# Altium schematic symbol library jlcpcb_2025_04_capacitors_extended_0603.schlib: 3668 symbols (part 16 of 20) (continued)
## GCM1885C2A180JA16D
designator C?  Capacitance: 18pF  (hidden comment: *)
Capacitor, Ceramic (MLCC), 18pF, ±5%, 100V, ±5%, SMD 0603; Manufacturer: Murata Electronics; Manufacturer Part Number: GCM1885C2A180JA16D; Package Size: 0603; JLCPCB Basic Part: No; JLCPCB Part Number: C913624; Supplier 1: LCSC; Category: Capacitors - MLCC; Supplier Part Number 1: C913624; Tolerance: ±5%; Voltage Rating: 100V; RoHS: Yes; ComponentLink1Description: Datasheet; ComponentLink1URL: https://wmsc.lcsc.com/wmsc/upload/file/pdf/v2/lcsc/2201131300_Murata-Electronics-GCM1885C2A180JA16D_C913624.pdf; ComponentLink2Description: JLCPCB Part URL; ComponentLink2URL: https://jlcpcb.com/partdetail/C913624; ComponentLink3Description: LCSC Part URL; ComponentLink3URL: https://lcsc.com/product-detail/Multilayer-Ceramic-Capacitors-MLCC---SMD-SMT_Murata-Electronics-Murata-Electronics-GCM1885C2A180JA16D_C913624.html
footprint CAP-0603 (0603 (1608M) Capacitor)
pins: 1, 2

## GCM1885C2A181FA16D
designator C?  Capacitance: 180pF  (hidden comment: *)
Capacitor, Ceramic (MLCC), 180pF, ±1%, 100V, ±1%, SMD 0603; Manufacturer: Murata Electronics; Manufacturer Part Number: GCM1885C2A181FA16D; Package Size: 0603; JLCPCB Basic Part: No; JLCPCB Part Number: C2170987; Supplier 1: LCSC; Category: Capacitors - MLCC; Supplier Part Number 1: C2170987; Tolerance: ±1%; Voltage Rating: 100V; RoHS: Yes; ComponentLink1Description: Datasheet; ComponentLink1URL: https://wmsc.lcsc.com/wmsc/upload/file/pdf/v2/lcsc/2202040500_Murata-Electronics-GCM1885C2A181FA16D_C2170987.pdf; ComponentLink2Description: JLCPCB Part URL; ComponentLink2URL: https://jlcpcb.com/partdetail/C2170987; ComponentLink3Description: LCSC Part URL; ComponentLink3URL: https://lcsc.com/product-detail/Multilayer-Ceramic-Capacitors-MLCC---SMD-SMT_Murata-Electronics-Murata-Electronics-GCM1885C2A181FA16D_C2170987.html
footprint CAP-0603 (0603 (1608M) Capacitor)
pins: 1, 2

## GCM1885C2A181JA16D
designator C?  Capacitance: 180pF  (hidden comment: *)
Capacitor, Ceramic (MLCC), 180pF, ±5%, 100V, null, ±5%, SMD 0603; Manufacturer: Murata Electronics; Manufacturer Part Number: GCM1885C2A181JA16D; Package Size: 0603; JLCPCB Basic Part: No; JLCPCB Part Number: C440148; Supplier 1: LCSC; Category: Capacitors - MLCC; Supplier Part Number 1: C440148; Tolerance: ±5%; Voltage Rating: 100V; Temperature Coefficient: null; RoHS: Yes; ComponentLink1Description: Datasheet; ComponentLink1URL: https://wmsc.lcsc.com/wmsc/upload/file/pdf/v2/lcsc/2304140030_Murata-Electronics-GCM1885C2A181JA16D_C440148.pdf; ComponentLink2Description: JLCPCB Part URL; ComponentLink2URL: https://jlcpcb.com/partdetail/C440148; ComponentLink3Description: LCSC Part URL; ComponentLink3URL: https://lcsc.com/product-detail/Multilayer-Ceramic-Capacitors-MLCC---SMD-SMT_Murata-Electronics-Murata-Electronics-GCM1885C2A181JA16D_C440148.html
footprint CAP-0603 (0603 (1608M) Capacitor)
pins: 1, 2

## GCM1885C2A200JA16D
designator C?  Capacitance: 20pF  (hidden comment: *)
Capacitor, Ceramic (MLCC), 20pF, ±5%, 100V, C0G, ±5%, SMD 0603; Manufacturer: Murata Electronics; Manufacturer Part Number: GCM1885C2A200JA16D; Package Size: 0603; JLCPCB Basic Part: No; JLCPCB Part Number: C710678; Supplier 1: LCSC; Category: Capacitors - MLCC; Supplier Part Number 1: C710678; Tolerance: ±5%; Voltage Rating: 100V; Temperature Coefficient: C0G; RoHS: Yes; ComponentLink1Description: Datasheet; ComponentLink1URL: https://wmsc.lcsc.com/wmsc/upload/file/pdf/v2/lcsc/2206281745_Murata-Electronics-GCM1885C2A200JA16D_C710678.pdf; ComponentLink2Description: JLCPCB Part URL; ComponentLink2URL: https://jlcpcb.com/partdetail/C710678; ComponentLink3Description: LCSC Part URL; ComponentLink3URL: https://lcsc.com/product-detail/Multilayer-Ceramic-Capacitors-MLCC---SMD-SMT_Murata-Electronics-Murata-Electronics-GCM1885C2A200JA16D_C710678.html
footprint CAP-0603 (0603 (1608M) Capacitor)
pins: 1, 2

## GCM1885C2A220FA16D
designator C?  Capacitance: 22pF  (hidden comment: *)
Capacitor, Ceramic (MLCC), 22pF, ±1%, 100V, ±1%, SMD 0603; Manufacturer: Murata Electronics; Manufacturer Part Number: GCM1885C2A220FA16D; Package Size: 0603; JLCPCB Basic Part: No; JLCPCB Part Number: C2169896; Supplier 1: LCSC; Category: Capacitors - MLCC; Supplier Part Number 1: C2169896; Tolerance: ±1%; Voltage Rating: 100V; RoHS: Yes; ComponentLink1Description: Datasheet; ComponentLink1URL: https://wmsc.lcsc.com/wmsc/upload/file/pdf/v2/lcsc/2202040400_Murata-Electronics-GCM1885C2A220FA16D_C2169896.pdf; ComponentLink2Description: JLCPCB Part URL; ComponentLink2URL: https://jlcpcb.com/partdetail/C2169896; ComponentLink3Description: LCSC Part URL; ComponentLink3URL: https://lcsc.com/product-detail/Multilayer-Ceramic-Capacitors-MLCC---SMD-SMT_Murata-Electronics-Murata-Electronics-GCM1885C2A220FA16D_C2169896.html
footprint CAP-0603 (0603 (1608M) Capacitor)
pins: 1, 2

## GCM1885C2A220JA16D
designator C?  Capacitance: 22pF  (hidden comment: *)
Capacitor, Ceramic (MLCC), 22pF, ±5%, 100V, C0G, ±5%, SMD 0603; Manufacturer: Murata Electronics; Manufacturer Part Number: GCM1885C2A220JA16D; Package Size: 0603; JLCPCB Basic Part: No; JLCPCB Part Number: C408549; Supplier 1: LCSC; Category: Capacitors - MLCC; Supplier Part Number 1: C408549; Tolerance: ±5%; Voltage Rating: 100V; Temperature Coefficient: C0G; RoHS: Yes; ComponentLink1Description: Datasheet; ComponentLink1URL: https://wmsc.lcsc.com/wmsc/upload/file/pdf/v2/lcsc/2304140030_Murata-Electronics-GCM1885C2A220JA16D_C408549.pdf; ComponentLink2Description: JLCPCB Part URL; ComponentLink2URL: https://jlcpcb.com/partdetail/C408549; ComponentLink3Description: LCSC Part URL; ComponentLink3URL: https://lcsc.com/product-detail/Multilayer-Ceramic-Capacitors-MLCC---SMD-SMT_Murata-Electronics-Murata-Electronics-GCM1885C2A220JA16D_C408549.html
footprint CAP-0603 (0603 (1608M) Capacitor)
pins: 1, 2

## GCM1885C2A221JA16D
designator C?  Capacitance: 220pF  (hidden comment: *)
Capacitor, Ceramic (MLCC), 220pF, ±5%, 100V, C0G, ±5%, SMD 0603; Manufacturer: Murata Electronics; Manufacturer Part Number: GCM1885C2A221JA16D; Package Size: 0603; JLCPCB Basic Part: No; JLCPCB Part Number: C388907; Supplier 1: LCSC; Category: Capacitors - MLCC; Supplier Part Number 1: C388907; Tolerance: ±5%; Voltage Rating: 100V; Temperature Coefficient: C0G; RoHS: Yes; ComponentLink1Description: Datasheet; ComponentLink1URL: https://wmsc.lcsc.com/wmsc/upload/file/pdf/v2/lcsc/1912111437_Murata-Electronics-GCM1885C2A221JA16D_C388907.pdf; ComponentLink2Description: JLCPCB Part URL; ComponentLink2URL: https://jlcpcb.com/partdetail/C388907; ComponentLink3Description: LCSC Part URL; ComponentLink3URL: https://lcsc.com/product-detail/Multilayer-Ceramic-Capacitors-MLCC---SMD-SMT_Murata-Electronics-Murata-Electronics-GCM1885C2A221JA16D_C388907.html
footprint CAP-0603 (0603 (1608M) Capacitor)
pins: 1, 2

## GCM1885C2A270FA16D
designator C?  Capacitance: 27pF  (hidden comment: *)
Capacitor, Ceramic (MLCC), 27pF, ±1%, 100V, ±1%, SMD 0603; Manufacturer: Murata Electronics; Manufacturer Part Number: GCM1885C2A270FA16D; Package Size: 0603; JLCPCB Basic Part: No; JLCPCB Part Number: C2176861; Supplier 1: LCSC; Category: Capacitors - MLCC; Supplier Part Number 1: C2176861; Tolerance: ±1%; Voltage Rating: 100V; RoHS: Yes; ComponentLink1Description: Datasheet; ComponentLink1URL: https://wmsc.lcsc.com/wmsc/upload/file/pdf/v2/lcsc/2202040830_Murata-Electronics-GCM1885C2A270FA16D_C2176861.pdf; ComponentLink2Description: JLCPCB Part URL; ComponentLink2URL: https://jlcpcb.com/partdetail/C2176861; ComponentLink3Description: LCSC Part URL; ComponentLink3URL: https://lcsc.com/product-detail/Multilayer-Ceramic-Capacitors-MLCC---SMD-SMT_Murata-Electronics-Murata-Electronics-GCM1885C2A270FA16D_C2176861.html
footprint CAP-0603 (0603 (1608M) Capacitor)
pins: 1, 2

## GCM1885C2A270JA16D
designator C?  Capacitance: 27pF  (hidden comment: *)
Capacitor, Ceramic (MLCC), 27pF, ±5%, 100V, ±5%, SMD 0603; Manufacturer: Murata Electronics; Manufacturer Part Number: GCM1885C2A270JA16D; Package Size: 0603; JLCPCB Basic Part: No; JLCPCB Part Number: C909846; Supplier 1: LCSC; Category: Capacitors - MLCC; Supplier Part Number 1: C909846; Tolerance: ±5%; Voltage Rating: 100V; RoHS: Yes; ComponentLink1Description: Datasheet; ComponentLink1URL: https://wmsc.lcsc.com/wmsc/upload/file/pdf/v2/lcsc/2304140030_Murata-Electronics-GCM1885C2A270JA16D_C909846.pdf; ComponentLink2Description: JLCPCB Part URL; ComponentLink2URL: https://jlcpcb.com/partdetail/C909846; ComponentLink3Description: LCSC Part URL; ComponentLink3URL: https://lcsc.com/product-detail/Multilayer-Ceramic-Capacitors-MLCC---SMD-SMT_Murata-Electronics-Murata-Electronics-GCM1885C2A270JA16D_C909846.html
footprint CAP-0603 (0603 (1608M) Capacitor)
pins: 1, 2

## GCM1885C2A271JA16D
designator C?  Capacitance: 270pF  (hidden comment: *)
Capacitor, Ceramic (MLCC), 270pF, ±5%, 100V, C0G, ±5%, SMD 0603; Manufacturer: Murata Electronics; Manufacturer Part Number: GCM1885C2A271JA16D; Package Size: 0603; JLCPCB Basic Part: No; JLCPCB Part Number: C2986280; Supplier 1: LCSC; Category: Capacitors - MLCC; Supplier Part Number 1: C2986280; Tolerance: ±5%; Voltage Rating: 100V; Temperature Coefficient: C0G; RoHS: Yes; ComponentLink1Description: Datasheet; ComponentLink1URL: https://wmsc.lcsc.com/wmsc/upload/file/pdf/v2/lcsc/2205121145_Murata-Electronics-GCM1885C2A271JA16D_C2986280.pdf; ComponentLink2Description: JLCPCB Part URL; ComponentLink2URL: https://jlcpcb.com/partdetail/C2986280; ComponentLink3Description: LCSC Part URL; ComponentLink3URL: https://lcsc.com/product-detail/Multilayer-Ceramic-Capacitors-MLCC---SMD-SMT_Murata-Electronics-Murata-Electronics-GCM1885C2A271JA16D_C2986280.html
footprint CAP-0603 (0603 (1608M) Capacitor)
pins: 1, 2

## GCM1885C2A301JA16D
designator C?  Capacitance: 300pF  (hidden comment: *)
Capacitor, Ceramic (MLCC), 300pF, ±5%, 100V, ±5%, SMD 0603; Manufacturer: Murata Electronics; Manufacturer Part Number: GCM1885C2A301JA16D; Package Size: 0603; JLCPCB Basic Part: No; JLCPCB Part Number: C2209773; Supplier 1: LCSC; Category: Capacitors - MLCC; Supplier Part Number 1: C2209773; Tolerance: ±5%; Voltage Rating: 100V; RoHS: Yes; ComponentLink1Description: Datasheet; ComponentLink1URL: https://wmsc.lcsc.com/wmsc/upload/file/pdf/v2/lcsc/2308111604_Murata-Electronics-GCM1885C2A301JA16D_C2209773.pdf; ComponentLink2Description: JLCPCB Part URL; ComponentLink2URL: https://jlcpcb.com/partdetail/C2209773; ComponentLink3Description: LCSC Part URL; ComponentLink3URL: https://lcsc.com/product-detail/Multilayer-Ceramic-Capacitors-MLCC---SMD-SMT_Murata-Electronics-Murata-Electronics-GCM1885C2A301JA16D_C2209773.html
footprint CAP-0603 (0603 (1608M) Capacitor)
pins: 1, 2

## GCM1885C2A330FA16D
designator C?  Capacitance: 33pF  (hidden comment: *)
Capacitor, Ceramic (MLCC), 33pF, ±1%, 100V, C0G, ±1%, SMD 0603; Manufacturer: Murata Electronics; Manufacturer Part Number: GCM1885C2A330FA16D; Package Size: 0603; JLCPCB Basic Part: No; JLCPCB Part Number: C3866175; Supplier 1: LCSC; Category: Capacitors - MLCC; Supplier Part Number 1: C3866175; Tolerance: ±1%; Voltage Rating: 100V; Temperature Coefficient: C0G; RoHS: Yes; ComponentLink1Description: Datasheet; ComponentLink1URL: https://wmsc.lcsc.com/wmsc/upload/file/pdf/v2/lcsc/2308111752_Murata-Electronics-GCM1885C2A330FA16D_C3866175.pdf; ComponentLink2Description: JLCPCB Part URL; ComponentLink2URL: https://jlcpcb.com/partdetail/C3866175; ComponentLink3Description: LCSC Part URL; ComponentLink3URL: https://lcsc.com/product-detail/Multilayer-Ceramic-Capacitors-MLCC---SMD-SMT_Murata-Electronics-Murata-Electronics-GCM1885C2A330FA16D_C3866175.html
footprint CAP-0603 (0603 (1608M) Capacitor)
pins: 1, 2

## GCM1885C2A330JA16D
designator C?  Capacitance: 33pF  (hidden comment: *)
Capacitor, Ceramic (MLCC), 33pF, ±5%, 100V, C0G, ±5%, SMD 0603; Manufacturer: Murata Electronics; Manufacturer Part Number: GCM1885C2A330JA16D; Package Size: 0603; JLCPCB Basic Part: No; JLCPCB Part Number: C126578; Supplier 1: LCSC; Category: Capacitors - MLCC; Supplier Part Number 1: C126578; Tolerance: ±5%; Voltage Rating: 100V; Temperature Coefficient: C0G; RoHS: Yes; ComponentLink1Description: Datasheet; ComponentLink1URL: https://wmsc.lcsc.com/wmsc/upload/file/pdf/v2/lcsc/1810311141_Murata-Electronics-GCM1885C2A330JA16D_C126578.pdf; ComponentLink2Description: JLCPCB Part URL; ComponentLink2URL: https://jlcpcb.com/partdetail/C126578; ComponentLink3Description: LCSC Part URL; ComponentLink3URL: https://lcsc.com/product-detail/Multilayer-Ceramic-Capacitors-MLCC---SMD-SMT_Murata-Electronics-Murata-Electronics-GCM1885C2A330JA16D_C126578.html
footprint CAP-0603 (0603 (1608M) Capacitor)
pins: 1, 2

## GCM1885C2A331JA16D
designator C?  Capacitance: 330pF  (hidden comment: *)
Capacitor, Ceramic (MLCC), 330pF, ±5%, 100V, C0G, ±5%, SMD 0603; Manufacturer: Murata Electronics; Manufacturer Part Number: GCM1885C2A331JA16D; Package Size: 0603; JLCPCB Basic Part: No; JLCPCB Part Number: C126579; Supplier 1: LCSC; Category: Capacitors - MLCC; Supplier Part Number 1: C126579; Tolerance: ±5%; Voltage Rating: 100V; Temperature Coefficient: C0G; RoHS: Yes; ComponentLink1Description: Datasheet; ComponentLink1URL: https://wmsc.lcsc.com/wmsc/upload/file/pdf/v2/lcsc/1810311134_Murata-Electronics-GCM1885C2A331JA16D_C126579.pdf; ComponentLink2Description: JLCPCB Part URL; ComponentLink2URL: https://jlcpcb.com/partdetail/C126579; ComponentLink3Description: LCSC Part URL; ComponentLink3URL: https://lcsc.com/product-detail/Multilayer-Ceramic-Capacitors-MLCC---SMD-SMT_Murata-Electronics-Murata-Electronics-GCM1885C2A331JA16D_C126579.html
footprint CAP-0603 (0603 (1608M) Capacitor)
pins: 1, 2

## GCM1885C2A390JA16D
designator C?  Capacitance: 39pF  (hidden comment: *)
Capacitor, Ceramic (MLCC), 39pF, ±5%, 100V, C0G, ±5%, SMD 0603; Manufacturer: Murata Electronics; Manufacturer Part Number: GCM1885C2A390JA16D; Package Size: 0603; JLCPCB Basic Part: No; JLCPCB Part Number: C354357; Supplier 1: LCSC; Category: Capacitors - MLCC; Supplier Part Number 1: C354357; Tolerance: ±5%; Voltage Rating: 100V; Temperature Coefficient: C0G; RoHS: Yes; ComponentLink1Description: Datasheet; ComponentLink1URL: https://wmsc.lcsc.com/wmsc/upload/file/pdf/v2/lcsc/1912111437_Murata-Electronics-GCM1885C2A390JA16D_C354357.pdf; ComponentLink2Description: JLCPCB Part URL; ComponentLink2URL: https://jlcpcb.com/partdetail/C354357; ComponentLink3Description: LCSC Part URL; ComponentLink3URL: https://lcsc.com/product-detail/Multilayer-Ceramic-Capacitors-MLCC---SMD-SMT_Murata-Electronics-Murata-Electronics-GCM1885C2A390JA16D_C354357.html
footprint CAP-0603 (0603 (1608M) Capacitor)
pins: 1, 2

## GCM1885C2A391JA16D
designator C?  Capacitance: 390pF  (hidden comment: *)
Capacitor, Ceramic (MLCC), 390pF, ±5%, 100V, ±5%, SMD 0603; Manufacturer: Murata Electronics; Manufacturer Part Number: GCM1885C2A391JA16D; Package Size: 0603; JLCPCB Basic Part: No; JLCPCB Part Number: C2170283; Supplier 1: LCSC; Category: Capacitors - MLCC; Supplier Part Number 1: C2170283; Tolerance: ±5%; Voltage Rating: 100V; RoHS: Yes; ComponentLink1Description: Datasheet; ComponentLink1URL: https://wmsc.lcsc.com/wmsc/upload/file/pdf/v2/lcsc/2202040430_Murata-Electronics-GCM1885C2A391JA16D_C2170283.pdf; ComponentLink2Description: JLCPCB Part URL; ComponentLink2URL: https://jlcpcb.com/partdetail/C2170283; ComponentLink3Description: LCSC Part URL; ComponentLink3URL: https://lcsc.com/product-detail/Multilayer-Ceramic-Capacitors-MLCC---SMD-SMT_Murata-Electronics-Murata-Electronics-GCM1885C2A391JA16D_C2170283.html
footprint CAP-0603 (0603 (1608M) Capacitor)
pins: 1, 2

## GCM1885C2A431JA16D
designator C?  Capacitance: 430pF  (hidden comment: *)
Capacitor, Ceramic (MLCC), 430pF, ±5%, 100V, ±5%, SMD 0603; Manufacturer: Murata Electronics; Manufacturer Part Number: GCM1885C2A431JA16D; Package Size: 0603; JLCPCB Basic Part: No; JLCPCB Part Number: C913561; Supplier 1: LCSC; Category: Capacitors - MLCC; Supplier Part Number 1: C913561; Tolerance: ±5%; Voltage Rating: 100V; RoHS: Yes; ComponentLink1Description: Datasheet; ComponentLink1URL: https://wmsc.lcsc.com/wmsc/upload/file/pdf/v2/lcsc/2304140030_Murata-Electronics-GCM1885C2A431JA16D_C913561.pdf; ComponentLink2Description: JLCPCB Part URL; ComponentLink2URL: https://jlcpcb.com/partdetail/C913561; ComponentLink3Description: LCSC Part URL; ComponentLink3URL: https://lcsc.com/product-detail/Multilayer-Ceramic-Capacitors-MLCC---SMD-SMT_Murata-Electronics-Murata-Electronics-GCM1885C2A431JA16D_C913561.html
footprint CAP-0603 (0603 (1608M) Capacitor)
pins: 1, 2

## GCM1885C2A470JA16D
designator C?  Capacitance: 47pF  (hidden comment: *)
Capacitor, Ceramic (MLCC), 47pF, ±5%, 100V, C0G, ±5%, SMD 0603; Manufacturer: Murata Electronics; Manufacturer Part Number: GCM1885C2A470JA16D; Package Size: 0603; JLCPCB Basic Part: No; JLCPCB Part Number: C126580; Supplier 1: LCSC; Category: Capacitors - MLCC; Supplier Part Number 1: C126580; Tolerance: ±5%; Voltage Rating: 100V; Temperature Coefficient: C0G; RoHS: Yes; ComponentLink1Description: Datasheet; ComponentLink1URL: https://wmsc.lcsc.com/wmsc/upload/file/pdf/v2/lcsc/1810311134_Murata-Electronics-GCM1885C2A470JA16D_C126580.pdf; ComponentLink2Description: JLCPCB Part URL; ComponentLink2URL: https://jlcpcb.com/partdetail/C126580; ComponentLink3Description: LCSC Part URL; ComponentLink3URL: https://lcsc.com/product-detail/Multilayer-Ceramic-Capacitors-MLCC---SMD-SMT_Murata-Electronics-Murata-Electronics-GCM1885C2A470JA16D_C126580.html
footprint CAP-0603 (0603 (1608M) Capacitor)
pins: 1, 2

## GCM1885C2A471GA16D
designator C?  Capacitance: 470pF  (hidden comment: *)
Capacitor, Ceramic (MLCC), 470pF, ±2%, 100V, C0G, ±2%, SMD 0603; Manufacturer: Murata Electronics; Manufacturer Part Number: GCM1885C2A471GA16D; Package Size: 0603; JLCPCB Basic Part: No; JLCPCB Part Number: C437459; Supplier 1: LCSC; Category: Capacitors - MLCC; Supplier Part Number 1: C437459; Tolerance: ±2%; Voltage Rating: 100V; Temperature Coefficient: C0G; RoHS: Yes; ComponentLink1Description: Datasheet; ComponentLink1URL: https://wmsc.lcsc.com/wmsc/upload/file/pdf/v2/lcsc/2304140030_Murata-Electronics-GCM1885C2A471GA16D_C437459.pdf; ComponentLink2Description: JLCPCB Part URL; ComponentLink2URL: https://jlcpcb.com/partdetail/C437459; ComponentLink3Description: LCSC Part URL; ComponentLink3URL: https://lcsc.com/product-detail/Multilayer-Ceramic-Capacitors-MLCC---SMD-SMT_Murata-Electronics-Murata-Electronics-GCM1885C2A471GA16D_C437459.html
footprint CAP-0603 (0603 (1608M) Capacitor)
pins: 1, 2

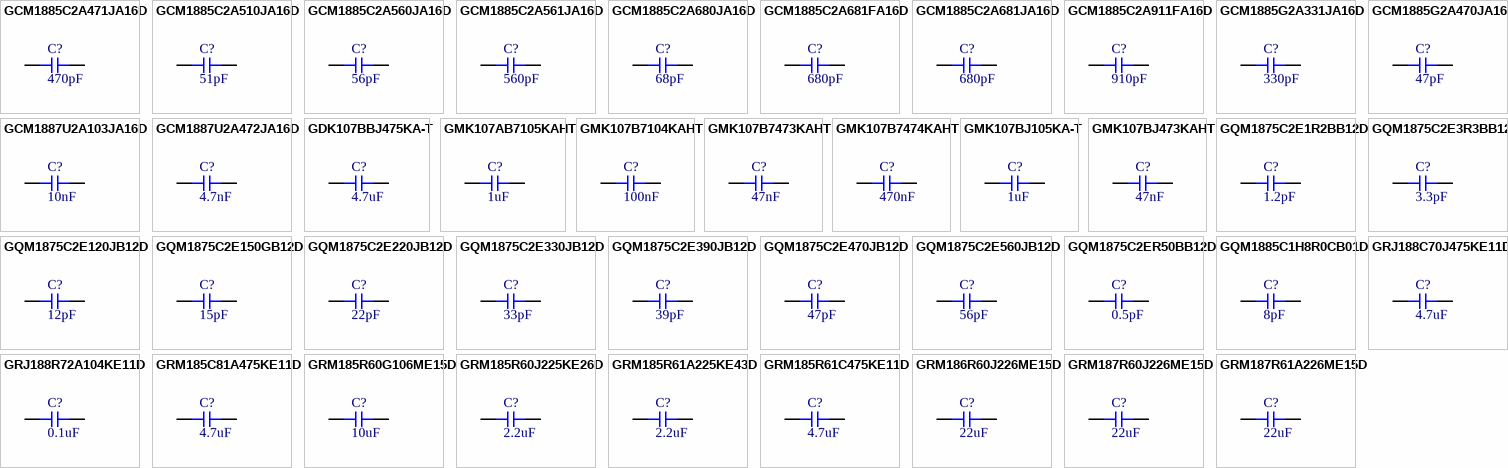
[diagram p71: symbols GCM1885C2A471JA16D to GRM187R61A226ME15D]

## GCM1885C2A471JA16D
designator C?  Capacitance: 470pF  (hidden comment: *)
Capacitor, Ceramic (MLCC), 470pF, ±5%, 100V, C0G, ±5%, SMD 0603; Manufacturer: Murata Electronics; Manufacturer Part Number: GCM1885C2A471JA16D; Package Size: 0603; JLCPCB Basic Part: No; JLCPCB Part Number: C184771; Supplier 1: LCSC; Category: Capacitors - MLCC; Supplier Part Number 1: C184771; Tolerance: ±5%; Voltage Rating: 100V; Temperature Coefficient: C0G; RoHS: Yes; ComponentLink1Description: Datasheet; ComponentLink1URL: https://wmsc.lcsc.com/wmsc/upload/file/pdf/v2/lcsc/1912111437_Murata-Electronics-GCM1885C2A471JA16D_C184771.pdf; ComponentLink2Description: JLCPCB Part URL; ComponentLink2URL: https://jlcpcb.com/partdetail/C184771; ComponentLink3Description: LCSC Part URL; ComponentLink3URL: https://lcsc.com/product-detail/Multilayer-Ceramic-Capacitors-MLCC---SMD-SMT_Murata-Electronics-Murata-Electronics-GCM1885C2A471JA16D_C184771.html
footprint CAP-0603 (0603 (1608M) Capacitor)
pins: 1, 2

## GCM1885C2A510JA16D
designator C?  Capacitance: 51pF  (hidden comment: *)
Capacitor, Ceramic (MLCC), 51pF, 100V, C0G, SMD 0603; Manufacturer: Murata Electronics; Manufacturer Part Number: GCM1885C2A510JA16D; Package Size: 0603; JLCPCB Basic Part: No; JLCPCB Part Number: C2941924; Supplier 1: LCSC; Category: Capacitors - MLCC; Supplier Part Number 1: C2941924; Voltage Rating: 100V; Temperature Coefficient: C0G; RoHS: Yes; ComponentLink1Description: Datasheet; ComponentLink1URL: https://wmsc.lcsc.com/wmsc/upload/file/pdf/v2/lcsc/2201121900_Murata-Electronics-GCM1885C2A510JA16D_C2941924.pdf; ComponentLink2Description: JLCPCB Part URL; ComponentLink2URL: https://jlcpcb.com/partdetail/C2941924; ComponentLink3Description: LCSC Part URL; ComponentLink3URL: https://lcsc.com/product-detail/Multilayer-Ceramic-Capacitors-MLCC---SMD-SMT_Murata-Electronics-Murata-Electronics-GCM1885C2A510JA16D_C2941924.html
footprint CAP-0603 (0603 (1608M) Capacitor)
pins: 1, 2

## GCM1885C2A560JA16D
designator C?  Capacitance: 56pF  (hidden comment: *)
Capacitor, Ceramic (MLCC), 56pF, ±5%, 100V, C0G, ±5%, SMD 0603; Manufacturer: Murata Electronics; Manufacturer Part Number: GCM1885C2A560JA16D; Package Size: 0603; JLCPCB Basic Part: No; JLCPCB Part Number: C490535; Supplier 1: LCSC; Category: Capacitors - MLCC; Supplier Part Number 1: C490535; Tolerance: ±5%; Voltage Rating: 100V; Temperature Coefficient: C0G; RoHS: Yes; ComponentLink1Description: Datasheet; ComponentLink1URL: https://wmsc.lcsc.com/wmsc/upload/file/pdf/v2/lcsc/2003111509_Murata-Electronics-GCM1885C2A560JA16D_C490535.pdf; ComponentLink2Description: JLCPCB Part URL; ComponentLink2URL: https://jlcpcb.com/partdetail/C490535; ComponentLink3Description: LCSC Part URL; ComponentLink3URL: https://lcsc.com/product-detail/Multilayer-Ceramic-Capacitors-MLCC---SMD-SMT_Murata-Electronics-Murata-Electronics-GCM1885C2A560JA16D_C490535.html
footprint CAP-0603 (0603 (1608M) Capacitor)
pins: 1, 2

## GCM1885C2A561JA16D
designator C?  Capacitance: 560pF  (hidden comment: *)
Capacitor, Ceramic (MLCC), 560pF, ±5%, 100V, C0G, ±5%, SMD 0603; Manufacturer: Murata Electronics; Manufacturer Part Number: GCM1885C2A561JA16D; Package Size: 0603; JLCPCB Basic Part: No; JLCPCB Part Number: C408121; Supplier 1: LCSC; Category: Capacitors - MLCC; Supplier Part Number 1: C408121; Tolerance: ±5%; Voltage Rating: 100V; Temperature Coefficient: C0G; RoHS: Yes; ComponentLink1Description: Datasheet; ComponentLink1URL: https://wmsc.lcsc.com/wmsc/upload/file/pdf/v2/lcsc/2304140030_Murata-Electronics-GCM1885C2A561JA16D_C408121.pdf; ComponentLink2Description: JLCPCB Part URL; ComponentLink2URL: https://jlcpcb.com/partdetail/C408121; ComponentLink3Description: LCSC Part URL; ComponentLink3URL: https://lcsc.com/product-detail/Multilayer-Ceramic-Capacitors-MLCC---SMD-SMT_Murata-Electronics-Murata-Electronics-GCM1885C2A561JA16D_C408121.html
footprint CAP-0603 (0603 (1608M) Capacitor)
pins: 1, 2

## GCM1885C2A680JA16D
designator C?  Capacitance: 68pF  (hidden comment: *)
Capacitor, Ceramic (MLCC), 68pF, ±5%, 100V, ±5%, SMD 0603; Manufacturer: Murata Electronics; Manufacturer Part Number: GCM1885C2A680JA16D; Package Size: 0603; JLCPCB Basic Part: No; JLCPCB Part Number: C701299; Supplier 1: LCSC; Category: Capacitors - MLCC; Supplier Part Number 1: C701299; Tolerance: ±5%; Voltage Rating: 100V; RoHS: Yes; ComponentLink1Description: Datasheet; ComponentLink1URL: https://wmsc.lcsc.com/wmsc/upload/file/pdf/v2/lcsc/2304140030_Murata-Electronics-GCM1885C2A680JA16D_C701299.pdf; ComponentLink2Description: JLCPCB Part URL; ComponentLink2URL: https://jlcpcb.com/partdetail/C701299; ComponentLink3Description: LCSC Part URL; ComponentLink3URL: https://lcsc.com/product-detail/Multilayer-Ceramic-Capacitors-MLCC---SMD-SMT_Murata-Electronics-Murata-Electronics-GCM1885C2A680JA16D_C701299.html
footprint CAP-0603 (0603 (1608M) Capacitor)
pins: 1, 2

## GCM1885C2A681FA16D
designator C?  Capacitance: 680pF  (hidden comment: *)
Capacitor, Ceramic (MLCC), 680pF, ±1%, 100V, C0G, ±1%, SMD 0603; Manufacturer: Murata Electronics; Manufacturer Part Number: GCM1885C2A681FA16D; Package Size: 0603; JLCPCB Basic Part: No; JLCPCB Part Number: C1864334; Supplier 1: LCSC; Category: Capacitors - MLCC; Supplier Part Number 1: C1864334; Tolerance: ±1%; Voltage Rating: 100V; Temperature Coefficient: C0G; RoHS: Yes; ComponentLink1Description: Datasheet; ComponentLink1URL: https://wmsc.lcsc.com/wmsc/upload/file/pdf/v2/lcsc/2108030330_Murata-Electronics-GCM1885C2A681FA16D_C1864334.pdf; ComponentLink2Description: JLCPCB Part URL; ComponentLink2URL: https://jlcpcb.com/partdetail/C1864334; ComponentLink3Description: LCSC Part URL; ComponentLink3URL: https://lcsc.com/product-detail/Multilayer-Ceramic-Capacitors-MLCC---SMD-SMT_Murata-Electronics-Murata-Electronics-GCM1885C2A681FA16D_C1864334.html
footprint CAP-0603 (0603 (1608M) Capacitor)
pins: 1, 2

## GCM1885C2A681JA16D
designator C?  Capacitance: 680pF  (hidden comment: *)
Capacitor, Ceramic (MLCC), 680pF, ±5%, 100V, C0G, ±5%, SMD 0603; Manufacturer: Murata Electronics; Manufacturer Part Number: GCM1885C2A681JA16D; Package Size: 0603; JLCPCB Basic Part: No; JLCPCB Part Number: C126581; Supplier 1: LCSC; Category: Capacitors - MLCC; Supplier Part Number 1: C126581; Tolerance: ±5%; Voltage Rating: 100V; Temperature Coefficient: C0G; RoHS: Yes; ComponentLink1Description: Datasheet; ComponentLink1URL: https://wmsc.lcsc.com/wmsc/upload/file/pdf/v2/lcsc/1810311141_Murata-Electronics-GCM1885C2A681JA16D_C126581.pdf; ComponentLink2Description: JLCPCB Part URL; ComponentLink2URL: https://jlcpcb.com/partdetail/C126581; ComponentLink3Description: LCSC Part URL; ComponentLink3URL: https://lcsc.com/product-detail/Multilayer-Ceramic-Capacitors-MLCC---SMD-SMT_Murata-Electronics-Murata-Electronics-GCM1885C2A681JA16D_C126581.html
footprint CAP-0603 (0603 (1608M) Capacitor)
pins: 1, 2

## GCM1885C2A911FA16D
designator C?  Capacitance: 910pF  (hidden comment: *)
Capacitor, Ceramic (MLCC), 910pF, ±1%, 100V, ±1%, SMD 0603; Manufacturer: Murata Electronics; Manufacturer Part Number: GCM1885C2A911FA16D; Package Size: 0603; JLCPCB Basic Part: No; JLCPCB Part Number: C883581; Supplier 1: LCSC; Category: Capacitors - MLCC; Supplier Part Number 1: C883581; Tolerance: ±1%; Voltage Rating: 100V; RoHS: Yes; ComponentLink1Description: Datasheet; ComponentLink1URL: https://wmsc.lcsc.com/wmsc/upload/file/pdf/v2/lcsc/2304140030_Murata-Electronics-GCM1885C2A911FA16D_C883581.pdf; ComponentLink2Description: JLCPCB Part URL; ComponentLink2URL: https://jlcpcb.com/partdetail/C883581; ComponentLink3Description: LCSC Part URL; ComponentLink3URL: https://lcsc.com/product-detail/Multilayer-Ceramic-Capacitors-MLCC---SMD-SMT_Murata-Electronics-Murata-Electronics-GCM1885C2A911FA16D_C883581.html
footprint CAP-0603 (0603 (1608M) Capacitor)
pins: 1, 2

## GCM1885G2A331JA16D
designator C?  Capacitance: 330pF  (hidden comment: *)
Capacitor, Ceramic (MLCC), 330pF, ±5%, 100V, X8G, ±5%, SMD 0603; Manufacturer: Murata Electronics; Manufacturer Part Number: GCM1885G2A331JA16D; Package Size: 0603; JLCPCB Basic Part: No; JLCPCB Part Number: C430706; Supplier 1: LCSC; Category: Capacitors - MLCC; Supplier Part Number 1: C430706; Tolerance: ±5%; Voltage Rating: 100V; Temperature Coefficient: X8G; RoHS: Yes; ComponentLink1Description: Datasheet; ComponentLink1URL: https://wmsc.lcsc.com/wmsc/upload/file/pdf/v2/lcsc/2304140030_Murata-Electronics-GCM1885G2A331JA16D_C430706.pdf; ComponentLink2Description: JLCPCB Part URL; ComponentLink2URL: https://jlcpcb.com/partdetail/C430706; ComponentLink3Description: LCSC Part URL; ComponentLink3URL: https://lcsc.com/product-detail/Multilayer-Ceramic-Capacitors-MLCC---SMD-SMT_Murata-Electronics-Murata-Electronics-GCM1885G2A331JA16D_C430706.html
footprint CAP-0603 (0603 (1608M) Capacitor)
pins: 1, 2

## GCM1885G2A470JA16D
designator C?  Capacitance: 47pF  (hidden comment: *)
Capacitor, Ceramic (MLCC), 47pF, ±5%, 100V, X8G, ±5%, SMD 0603; Manufacturer: Murata Electronics; Manufacturer Part Number: GCM1885G2A470JA16D; Package Size: 0603; JLCPCB Basic Part: No; JLCPCB Part Number: C470856; Supplier 1: LCSC; Category: Capacitors - MLCC; Supplier Part Number 1: C470856; Tolerance: ±5%; Voltage Rating: 100V; Temperature Coefficient: X8G; RoHS: Yes; ComponentLink1Description: Datasheet; ComponentLink1URL: https://wmsc.lcsc.com/wmsc/upload/file/pdf/v2/lcsc/2304140030_Murata-Electronics-GCM1885G2A470JA16D_C470856.pdf; ComponentLink2Description: JLCPCB Part URL; ComponentLink2URL: https://jlcpcb.com/partdetail/C470856; ComponentLink3Description: LCSC Part URL; ComponentLink3URL: https://lcsc.com/product-detail/Multilayer-Ceramic-Capacitors-MLCC---SMD-SMT_Murata-Electronics-Murata-Electronics-GCM1885G2A470JA16D_C470856.html
footprint CAP-0603 (0603 (1608M) Capacitor)
pins: 1, 2

## GCM1887U2A103JA16D
designator C?  Capacitance: 10nF  (hidden comment: *)
Capacitor, Ceramic (MLCC), 10nF, 100V, U2J, SMD 0603; Manufacturer: Murata Electronics; Manufacturer Part Number: GCM1887U2A103JA16D; Package Size: 0603; JLCPCB Basic Part: No; JLCPCB Part Number: C2986269; Supplier 1: LCSC; Category: Capacitors - MLCC; Supplier Part Number 1: C2986269; Voltage Rating: 100V; Temperature Coefficient: U2J; RoHS: Yes; ComponentLink1Description: Datasheet; ComponentLink1URL: https://wmsc.lcsc.com/wmsc/upload/file/pdf/v2/lcsc/2207261030_Murata-Electronics-GCM1887U2A103JA16D_C2986269.pdf; ComponentLink2Description: JLCPCB Part URL; ComponentLink2URL: https://jlcpcb.com/partdetail/C2986269; ComponentLink3Description: LCSC Part URL; ComponentLink3URL: https://lcsc.com/product-detail/Multilayer-Ceramic-Capacitors-MLCC---SMD-SMT_Murata-Electronics-Murata-Electronics-GCM1887U2A103JA16D_C2986269.html
footprint CAP-0603 (0603 (1608M) Capacitor)
pins: 1, 2

## GCM1887U2A472JA16D
designator C?  Capacitance: 4.7nF  (hidden comment: *)
Capacitor, Ceramic (MLCC), 4.7nF, ±5%, 100V, U2J, ±5%, SMD 0603; Manufacturer: Murata Electronics; Manufacturer Part Number: GCM1887U2A472JA16D; Package Size: 0603; JLCPCB Basic Part: No; JLCPCB Part Number: C783267; Supplier 1: LCSC; Category: Capacitors - MLCC; Supplier Part Number 1: C783267; Tolerance: ±5%; Voltage Rating: 100V; Temperature Coefficient: U2J; RoHS: Yes; ComponentLink1Description: Datasheet; ComponentLink1URL: https://wmsc.lcsc.com/wmsc/upload/file/pdf/v2/lcsc/2308111605_Murata-Electronics-GCM1887U2A472JA16D_C783267.pdf; ComponentLink2Description: JLCPCB Part URL; ComponentLink2URL: https://jlcpcb.com/partdetail/C783267; ComponentLink3Description: LCSC Part URL; ComponentLink3URL: https://lcsc.com/product-detail/Multilayer-Ceramic-Capacitors-MLCC---SMD-SMT_Murata-Electronics-Murata-Electronics-GCM1887U2A472JA16D_C783267.html
footprint CAP-0603 (0603 (1608M) Capacitor)
pins: 1, 2

## GDK107BBJ475KA-T
designator C?  Capacitance: 4.7uF  (hidden comment: *)
Capacitor, Ceramic (MLCC), 4.7uF, ±10%, 35V, ±10%, SMD 0603; Manufacturer: Taiyo Yuden; Manufacturer Part Number: GDK107BBJ475KA-T; Package Size: 0603; JLCPCB Basic Part: No; JLCPCB Part Number: C841052; Supplier 1: LCSC; Category: Capacitors - MLCC; Supplier Part Number 1: C841052; Tolerance: ±10%; Voltage Rating: 35V; RoHS: Yes; ComponentLink1Description: Datasheet; ComponentLink1URL: https://wmsc.lcsc.com/wmsc/upload/file/pdf/v2/lcsc/2304140030_Taiyo-Yuden-GDK107BBJ475KA-T_C841052.pdf; ComponentLink2Description: JLCPCB Part URL; ComponentLink2URL: https://jlcpcb.com/partdetail/C841052; ComponentLink3Description: LCSC Part URL; ComponentLink3URL: https://lcsc.com/product-detail/Multilayer-Ceramic-Capacitors-MLCC---SMD-SMT_Taiyo-Yuden-Taiyo-Yuden-GDK107BBJ475KA-T_C841052.html
footprint CAP-0603 (0603 (1608M) Capacitor)
pins: 1, 2

## GMK107AB7105KAHT
designator C?  Capacitance: 1uF  (hidden comment: *)
Capacitor, Ceramic (MLCC), 1uF, ±10%, 35V, X7R, ±10%, SMD 0603; Manufacturer: Taiyo Yuden; Manufacturer Part Number: GMK107AB7105KAHT; Package Size: 0603; JLCPCB Basic Part: No; JLCPCB Part Number: C841050; Supplier 1: LCSC; Category: Capacitors - MLCC; Supplier Part Number 1: C841050; Tolerance: ±10%; Voltage Rating: 35V; Temperature Coefficient: X7R; RoHS: Yes; ComponentLink1Description: Datasheet; ComponentLink1URL: https://wmsc.lcsc.com/wmsc/upload/file/pdf/v2/lcsc/2304140030_Taiyo-Yuden-GMK107AB7105KAHT_C841050.pdf; ComponentLink2Description: JLCPCB Part URL; ComponentLink2URL: https://jlcpcb.com/partdetail/C841050; ComponentLink3Description: LCSC Part URL; ComponentLink3URL: https://lcsc.com/product-detail/Multilayer-Ceramic-Capacitors-MLCC---SMD-SMT_Taiyo-Yuden-Taiyo-Yuden-GMK107AB7105KAHT_C841050.html
footprint CAP-0603 (0603 (1608M) Capacitor)
pins: 1, 2

## GMK107B7104KAHT
designator C?  Capacitance: 100nF  (hidden comment: *)
Capacitor, Ceramic (MLCC), 100nF, ±10%, 35V, X7R, ±10%, SMD 0603; Manufacturer: Taiyo Yuden; Manufacturer Part Number: GMK107B7104KAHT; Package Size: 0603; JLCPCB Basic Part: No; JLCPCB Part Number: C385964; Supplier 1: LCSC; Category: Capacitors - MLCC; Supplier Part Number 1: C385964; Tolerance: ±10%; Voltage Rating: 35V; Temperature Coefficient: X7R; RoHS: Yes; ComponentLink1Description: Datasheet; ComponentLink1URL: https://wmsc.lcsc.com/wmsc/upload/file/pdf/v2/lcsc/2202251630_Taiyo-Yuden-GMK107B7104KAHT_C385964.pdf; ComponentLink2Description: JLCPCB Part URL; ComponentLink2URL: https://jlcpcb.com/partdetail/C385964; ComponentLink3Description: LCSC Part URL; ComponentLink3URL: https://lcsc.com/product-detail/Multilayer-Ceramic-Capacitors-MLCC---SMD-SMT_Taiyo-Yuden-Taiyo-Yuden-GMK107B7104KAHT_C385964.html
footprint CAP-0603 (0603 (1608M) Capacitor)
pins: 1, 2

## GMK107B7473KAHT
designator C?  Capacitance: 47nF  (hidden comment: *)
Capacitor, Ceramic (MLCC), 47nF, ±10%, 35V, X7R, ±10%, SMD 0603; Manufacturer: Taiyo Yuden; Manufacturer Part Number: GMK107B7473KAHT; Package Size: 0603; JLCPCB Basic Part: No; JLCPCB Part Number: C651006; Supplier 1: LCSC; Category: Capacitors - MLCC; Supplier Part Number 1: C651006; Tolerance: ±10%; Voltage Rating: 35V; Temperature Coefficient: X7R; RoHS: Yes; ComponentLink1Description: Datasheet; ComponentLink1URL: https://wmsc.lcsc.com/wmsc/upload/file/pdf/v2/lcsc/2304140030_Taiyo-Yuden-GMK107B7473KAHT_C651006.pdf; ComponentLink2Description: JLCPCB Part URL; ComponentLink2URL: https://jlcpcb.com/partdetail/C651006; ComponentLink3Description: LCSC Part URL; ComponentLink3URL: https://lcsc.com/product-detail/Multilayer-Ceramic-Capacitors-MLCC---SMD-SMT_Taiyo-Yuden-Taiyo-Yuden-GMK107B7473KAHT_C651006.html
footprint CAP-0603 (0603 (1608M) Capacitor)
pins: 1, 2

## GMK107B7474KAHT
designator C?  Capacitance: 470nF  (hidden comment: *)
Capacitor, Ceramic (MLCC), 470nF, ±10%, 35V, X7R, ±10%, SMD 0603; Manufacturer: Taiyo Yuden; Manufacturer Part Number: GMK107B7474KAHT; Package Size: 0603; JLCPCB Basic Part: No; JLCPCB Part Number: C385965; Supplier 1: LCSC; Category: Capacitors - MLCC; Supplier Part Number 1: C385965; Tolerance: ±10%; Voltage Rating: 35V; Temperature Coefficient: X7R; RoHS: Yes; ComponentLink1Description: Datasheet; ComponentLink1URL: https://wmsc.lcsc.com/wmsc/upload/file/pdf/v2/lcsc/2110191430_Taiyo-Yuden-GMK107B7474KAHT_C385965.pdf; ComponentLink2Description: JLCPCB Part URL; ComponentLink2URL: https://jlcpcb.com/partdetail/C385965; ComponentLink3Description: LCSC Part URL; ComponentLink3URL: https://lcsc.com/product-detail/Multilayer-Ceramic-Capacitors-MLCC---SMD-SMT_Taiyo-Yuden-Taiyo-Yuden-GMK107B7474KAHT_C385965.html
footprint CAP-0603 (0603 (1608M) Capacitor)
pins: 1, 2

## GMK107BJ105KA-T
designator C?  Capacitance: 1uF  (hidden comment: *)
Capacitor, Ceramic (MLCC), 1uF, ±10%, 35V, X5R, ±10%, SMD 0603; Manufacturer: Taiyo Yuden; Manufacturer Part Number: GMK107BJ105KA-T; Package Size: 0603; JLCPCB Basic Part: No; JLCPCB Part Number: C92796; Supplier 1: LCSC; Category: Capacitors - MLCC; Supplier Part Number 1: C92796; Tolerance: ±10%; Voltage Rating: 35V; Temperature Coefficient: X5R; RoHS: Yes; ComponentLink1Description: Datasheet; ComponentLink1URL: https://wmsc.lcsc.com/wmsc/upload/file/pdf/v2/lcsc/2211282300_Taiyo-Yuden-GMK107BJ105KA-T_C92796.pdf; ComponentLink2Description: JLCPCB Part URL; ComponentLink2URL: https://jlcpcb.com/partdetail/C92796; ComponentLink3Description: LCSC Part URL; ComponentLink3URL: https://lcsc.com/product-detail/Multilayer-Ceramic-Capacitors-MLCC---SMD-SMT_Taiyo-Yuden-Taiyo-Yuden-GMK107BJ105KA-T_C92796.html
footprint CAP-0603 (0603 (1608M) Capacitor)
pins: 1, 2

## GMK107BJ473KAHT
designator C?  Capacitance: 47nF  (hidden comment: *)
Capacitor, Ceramic (MLCC), 47nF, ±10%, 35V, X5R, ±10%, SMD 0603; Manufacturer: Taiyo Yuden; Manufacturer Part Number: GMK107BJ473KAHT; Package Size: 0603; JLCPCB Basic Part: No; JLCPCB Part Number: C651012; Supplier 1: LCSC; Category: Capacitors - MLCC; Supplier Part Number 1: C651012; Tolerance: ±10%; Voltage Rating: 35V; Temperature Coefficient: X5R; RoHS: Yes; ComponentLink1Description: Datasheet; ComponentLink1URL: https://wmsc.lcsc.com/wmsc/upload/file/pdf/v2/lcsc/2304140030_Taiyo-Yuden-GMK107BJ473KAHT_C651012.pdf; ComponentLink2Description: JLCPCB Part URL; ComponentLink2URL: https://jlcpcb.com/partdetail/C651012; ComponentLink3Description: LCSC Part URL; ComponentLink3URL: https://lcsc.com/product-detail/Multilayer-Ceramic-Capacitors-MLCC---SMD-SMT_Taiyo-Yuden-Taiyo-Yuden-GMK107BJ473KAHT_C651012.html
footprint CAP-0603 (0603 (1608M) Capacitor)
pins: 1, 2

## GQM1875C2E1R2BB12D
designator C?  Capacitance: 1.2pF  (hidden comment: *)
Capacitor, Ceramic (MLCC), 1.2pF, 250V, null, SMD 0603; Manufacturer: Murata Electronics; Manufacturer Part Number: GQM1875C2E1R2BB12D; Package Size: 0603; JLCPCB Basic Part: No; JLCPCB Part Number: C913582; Supplier 1: LCSC; Category: Capacitors - MLCC; Supplier Part Number 1: C913582; Voltage Rating: 250V; Temperature Coefficient: null; RoHS: Yes; ComponentLink1Description: Datasheet; ComponentLink1URL: https://wmsc.lcsc.com/wmsc/upload/file/pdf/v2/lcsc/2201131300_Murata-Electronics-GQM1875C2E1R2BB12D_C913582.pdf; ComponentLink2Description: JLCPCB Part URL; ComponentLink2URL: https://jlcpcb.com/partdetail/C913582; ComponentLink3Description: LCSC Part URL; ComponentLink3URL: https://lcsc.com/product-detail/Multilayer-Ceramic-Capacitors-MLCC---SMD-SMT_Murata-Electronics-Murata-Electronics-GQM1875C2E1R2BB12D_C913582.html
footprint CAP-0603 (0603 (1608M) Capacitor)
pins: 1, 2

## GQM1875C2E3R3BB12D
designator C?  Capacitance: 3.3pF  (hidden comment: *)
Capacitor, Ceramic (MLCC), 3.3pF, 250V, C0G, SMD 0603; Manufacturer: Murata Electronics; Manufacturer Part Number: GQM1875C2E3R3BB12D; Package Size: 0603; JLCPCB Basic Part: No; JLCPCB Part Number: C882553; Supplier 1: LCSC; Category: Capacitors - MLCC; Supplier Part Number 1: C882553; Voltage Rating: 250V; Temperature Coefficient: C0G; RoHS: Yes; ComponentLink1Description: Datasheet; ComponentLink1URL: https://wmsc.lcsc.com/wmsc/upload/file/pdf/v2/lcsc/2108182030_Murata-Electronics-GQM1875C2E3R3BB12D_C882553.pdf; ComponentLink2Description: JLCPCB Part URL; ComponentLink2URL: https://jlcpcb.com/partdetail/C882553; ComponentLink3Description: LCSC Part URL; ComponentLink3URL: https://lcsc.com/product-detail/Multilayer-Ceramic-Capacitors-MLCC---SMD-SMT_Murata-Electronics-Murata-Electronics-GQM1875C2E3R3BB12D_C882553.html
footprint CAP-0603 (0603 (1608M) Capacitor)
pins: 1, 2

## GQM1875C2E120JB12D
designator C?  Capacitance: 12pF  (hidden comment: *)
Capacitor, Ceramic (MLCC), 12pF, ±5%, 250V, C0G, ±5%, SMD 0603; Manufacturer: Murata Electronics; Manufacturer Part Number: GQM1875C2E120JB12D; Package Size: 0603; JLCPCB Basic Part: No; JLCPCB Part Number: C913584; Supplier 1: LCSC; Category: Capacitors - MLCC; Supplier Part Number 1: C913584; Tolerance: ±5%; Voltage Rating: 250V; Temperature Coefficient: C0G; RoHS: Yes; ComponentLink1Description: Datasheet; ComponentLink1URL: https://wmsc.lcsc.com/wmsc/upload/file/pdf/v2/lcsc/2201131300_Murata-Electronics-GQM1875C2E120JB12D_C913584.pdf; ComponentLink2Description: JLCPCB Part URL; ComponentLink2URL: https://jlcpcb.com/partdetail/C913584; ComponentLink3Description: LCSC Part URL; ComponentLink3URL: https://lcsc.com/product-detail/Multilayer-Ceramic-Capacitors-MLCC---SMD-SMT_Murata-Electronics-Murata-Electronics-GQM1875C2E120JB12D_C913584.html
footprint CAP-0603 (0603 (1608M) Capacitor)
pins: 1, 2

## GQM1875C2E150GB12D
designator C?  Capacitance: 15pF  (hidden comment: *)
Capacitor, Ceramic (MLCC), 15pF, ±2%, 250V, C0G, ±2%, SMD 0603; Manufacturer: Murata Electronics; Manufacturer Part Number: GQM1875C2E150GB12D; Package Size: 0603; JLCPCB Basic Part: No; JLCPCB Part Number: C464956; Supplier 1: LCSC; Category: Capacitors - MLCC; Supplier Part Number 1: C464956; Tolerance: ±2%; Voltage Rating: 250V; Temperature Coefficient: C0G; RoHS: Yes; ComponentLink1Description: Datasheet; ComponentLink1URL: https://wmsc.lcsc.com/wmsc/upload/file/pdf/v2/lcsc/1912111437_Murata-Electronics-GQM1875C2E150GB12D_C464956.pdf; ComponentLink2Description: JLCPCB Part URL; ComponentLink2URL: https://jlcpcb.com/partdetail/C464956; ComponentLink3Description: LCSC Part URL; ComponentLink3URL: https://lcsc.com/product-detail/Multilayer-Ceramic-Capacitors-MLCC---SMD-SMT_Murata-Electronics-Murata-Electronics-GQM1875C2E150GB12D_C464956.html
footprint CAP-0603 (0603 (1608M) Capacitor)
pins: 1, 2

## GQM1875C2E220JB12D
designator C?  Capacitance: 22pF  (hidden comment: *)
Capacitor, Ceramic (MLCC), 22pF, ±5%, 250V, C0G, ±5%, SMD 0603; Manufacturer: Murata Electronics; Manufacturer Part Number: GQM1875C2E220JB12D; Package Size: 0603; JLCPCB Basic Part: No; JLCPCB Part Number: C527592; Supplier 1: LCSC; Category: Capacitors - MLCC; Supplier Part Number 1: C527592; Tolerance: ±5%; Voltage Rating: 250V; Temperature Coefficient: C0G; RoHS: Yes; ComponentLink1Description: Datasheet; ComponentLink1URL: https://wmsc.lcsc.com/wmsc/upload/file/pdf/v2/lcsc/2008051835_Murata-Electronics-GQM1875C2E220JB12D_C527592.pdf; ComponentLink2Description: JLCPCB Part URL; ComponentLink2URL: https://jlcpcb.com/partdetail/C527592; ComponentLink3Description: LCSC Part URL; ComponentLink3URL: https://lcsc.com/product-detail/Multilayer-Ceramic-Capacitors-MLCC---SMD-SMT_Murata-Electronics-Murata-Electronics-GQM1875C2E220JB12D_C527592.html
footprint CAP-0603 (0603 (1608M) Capacitor)
pins: 1, 2

## GQM1875C2E330JB12D
designator C?  Capacitance: 33pF  (hidden comment: *)
Capacitor, Ceramic (MLCC), 33pF, ±5%, 250V, null, ±5%, SMD 0603; Manufacturer: Murata Electronics; Manufacturer Part Number: GQM1875C2E330JB12D; Package Size: 0603; JLCPCB Basic Part: No; JLCPCB Part Number: C913596; Supplier 1: LCSC; Category: Capacitors - MLCC; Supplier Part Number 1: C913596; Tolerance: ±5%; Voltage Rating: 250V; Temperature Coefficient: null; RoHS: Yes; ComponentLink1Description: Datasheet; ComponentLink1URL: https://wmsc.lcsc.com/wmsc/upload/file/pdf/v2/lcsc/2201131300_Murata-Electronics-GQM1875C2E330JB12D_C913596.pdf; ComponentLink2Description: JLCPCB Part URL; ComponentLink2URL: https://jlcpcb.com/partdetail/C913596; ComponentLink3Description: LCSC Part URL; ComponentLink3URL: https://lcsc.com/product-detail/Multilayer-Ceramic-Capacitors-MLCC---SMD-SMT_Murata-Electronics-Murata-Electronics-GQM1875C2E330JB12D_C913596.html
footprint CAP-0603 (0603 (1608M) Capacitor)
pins: 1, 2

## GQM1875C2E390JB12D
designator C?  Capacitance: 39pF  (hidden comment: *)
Capacitor, Ceramic (MLCC), 39pF, ±5%, 250V, C0G, ±5%, SMD 0603; Manufacturer: Murata Electronics; Manufacturer Part Number: GQM1875C2E390JB12D; Package Size: 0603; JLCPCB Basic Part: No; JLCPCB Part Number: C237607; Supplier 1: LCSC; Category: Capacitors - MLCC; Supplier Part Number 1: C237607; Tolerance: ±5%; Voltage Rating: 250V; Temperature Coefficient: C0G; RoHS: Yes; ComponentLink1Description: Datasheet; ComponentLink1URL: https://wmsc.lcsc.com/wmsc/upload/file/pdf/v2/lcsc/2202161830_Murata-Electronics-GQM1875C2E390JB12D_C237607.pdf; ComponentLink2Description: JLCPCB Part URL; ComponentLink2URL: https://jlcpcb.com/partdetail/C237607; ComponentLink3Description: LCSC Part URL; ComponentLink3URL: https://lcsc.com/product-detail/Multilayer-Ceramic-Capacitors-MLCC---SMD-SMT_Murata-Electronics-Murata-Electronics-GQM1875C2E390JB12D_C237607.html
footprint CAP-0603 (0603 (1608M) Capacitor)
pins: 1, 2